# Altium footprint library ref-packages-longpad.PCBLIB: 1527 footprints (part 77 of 103)
Each footprint in its own frame and in the unit in brackets; x right, y up, seen from the top. Pads: shape width x height; smd on the part's side, far side on the other; paste and mask are expansions set on the pad; w line width, h text height; cw(c..) or ccw(c..) is an arc to the next point about the centre after c.
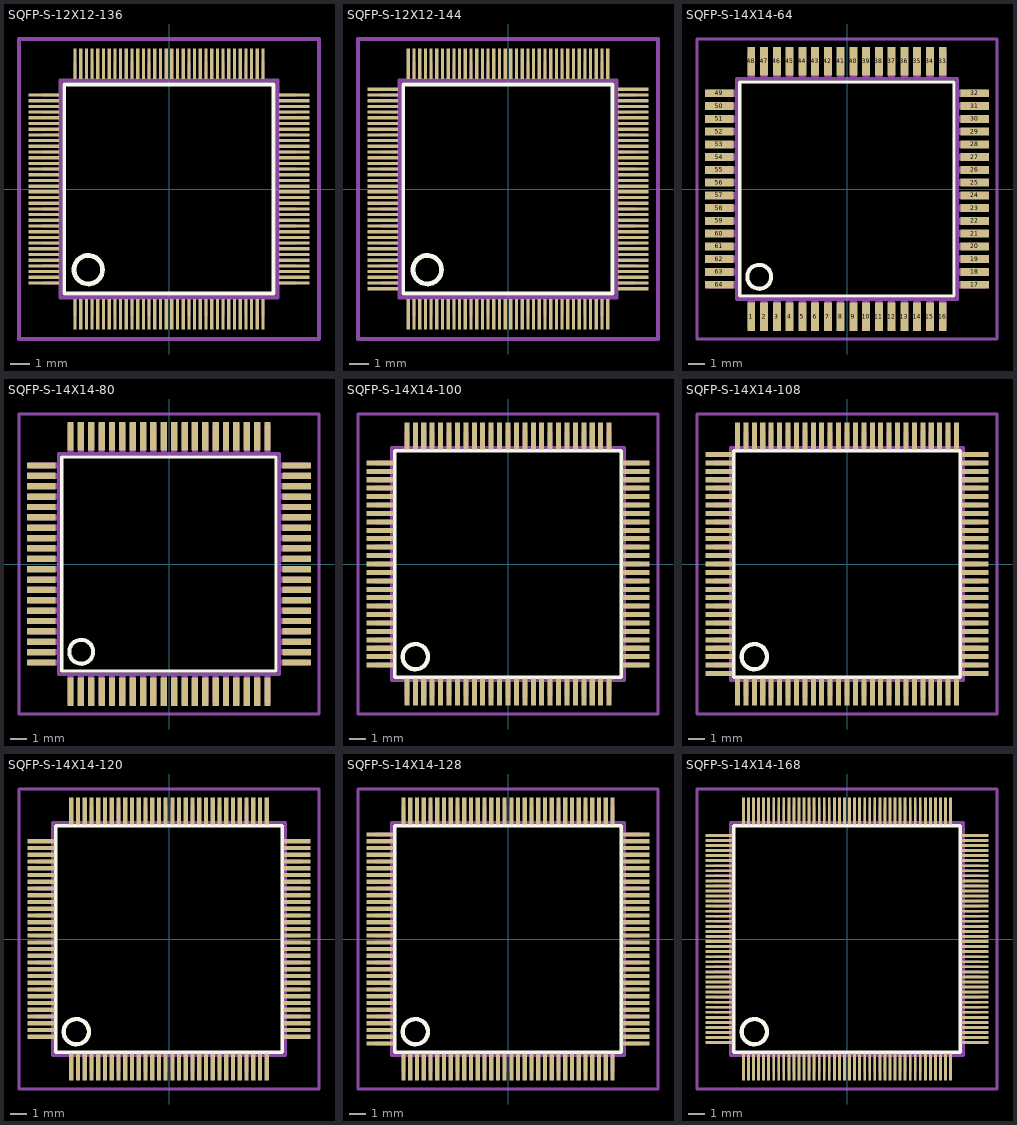
[diagram p76: the footprints below, top view; thin cyan lines are the x and y axes]

## SQFP-S-12X12-136 [mm]
pads (136):
  rect 0.17x1.6 smd: 1(-4.95,-6.6) 2(-4.65,-6.6) 3(-4.35,-6.6) 4(-4.05,-6.6) 5(-3.75,-6.6) 6(-3.45,-6.6) 7(-3.15,-6.6) 8(-2.85,-6.6) 9(-2.55,-6.6) 10(-2.25,-6.6) 11(-1.95,-6.6) 12(-1.65,-6.6) 13(-1.35,-6.6) 14(-1.05,-6.6) 15(-0.75,-6.6) 16(-0.45,-6.6) 17(-0.15,-6.6) 18(0.15,-6.6) 19(0.45,-6.6) 20(0.75,-6.6) 21(1.05,-6.6) 22(1.35,-6.6) 23(1.65,-6.6) 24(1.95,-6.6) 25(2.25,-6.6) 26(2.55,-6.6) 27(2.85,-6.6) 28(3.15,-6.6) 29(3.45,-6.6) 30(3.75,-6.6) 31(4.05,-6.6) 32(4.35,-6.6) 33(4.65,-6.6) 34(4.95,-6.6) 69(4.95,6.6) 70(4.65,6.6) 71(4.35,6.6) 72(4.05,6.6) 73(3.75,6.6) 74(3.45,6.6) 75(3.15,6.6) 76(2.85,6.6) 77(2.55,6.6) 78(2.25,6.6) 79(1.95,6.6) 80(1.65,6.6) 81(1.35,6.6) 82(1.05,6.6) 83(0.75,6.6) 84(0.45,6.6) 85(0.15,6.6) 86(-0.15,6.6) 87(-0.45,6.6) 88(-0.75,6.6) 89(-1.05,6.6) 90(-1.35,6.6) 91(-1.65,6.6) 92(-1.95,6.6) 93(-2.25,6.6) 94(-2.55,6.6) 95(-2.85,6.6) 96(-3.15,6.6) 97(-3.45,6.6) 98(-3.75,6.6) 99(-4.05,6.6) 100(-4.35,6.6) 101(-4.65,6.6) 102(-4.95,6.6)
  rect 1.6x0.17 smd: 35(6.6,-4.95) 36(6.6,-4.65) 37(6.6,-4.35) 38(6.6,-4.05) 39(6.6,-3.75) 40(6.6,-3.45) 41(6.6,-3.15) 42(6.6,-2.85) 43(6.6,-2.55) 44(6.6,-2.25) 45(6.6,-1.95) 46(6.6,-1.65) 47(6.6,-1.35) 48(6.6,-1.05) 49(6.6,-0.75) 50(6.6,-0.45) 51(6.6,-0.15) 52(6.6,0.15) 53(6.6,0.45) 54(6.6,0.75) 55(6.6,1.05) 56(6.6,1.35) 57(6.6,1.65) 58(6.6,1.95) 59(6.6,2.25) 60(6.6,2.55) 61(6.6,2.85) 62(6.6,3.15) 63(6.6,3.45) 64(6.6,3.75) 65(6.6,4.05) 66(6.6,4.35) 67(6.6,4.65) 68(6.6,4.95) 103(-6.6,4.95) 104(-6.6,4.65) 105(-6.6,4.35) 106(-6.6,4.05) 107(-6.6,3.75) 108(-6.6,3.45) 109(-6.6,3.15) 110(-6.6,2.85) 111(-6.6,2.55) 112(-6.6,2.25) 113(-6.6,1.95) 114(-6.6,1.65) 115(-6.6,1.35) 116(-6.6,1.05) 117(-6.6,0.75) 118(-6.6,0.45) 119(-6.6,0.15) 120(-6.6,-0.15) 121(-6.6,-0.45) 122(-6.6,-0.75) 123(-6.6,-1.05) 124(-6.6,-1.35) 125(-6.6,-1.65) 126(-6.6,-1.95) 127(-6.6,-2.25) 128(-6.6,-2.55) 129(-6.6,-2.85) 130(-6.6,-3.15) 131(-6.6,-3.45) 132(-6.6,-3.75) 133(-6.6,-4.05) 134(-6.6,-4.35) 135(-6.6,-4.65) 136(-6.6,-4.95)
Top Overlay:
  circle w0.254: c-4.25,-4.25 r0.75
  lines w0.203: -5.52,-5.51 5.51,-5.51 5.51,5.51 -5.52,5.51 -5.52,-5.51
Mechanical 16:
  rectangle: -5.02,-6.7 -4.88,-5.75
  rectangle: -4.72,-6.7 -4.58,-5.75
  rectangle: -4.42,-6.7 -4.28,-5.75
  rectangle: -4.12,-6.7 -3.98,-5.75
  rectangle: -3.82,-6.7 -3.68,-5.75
  rectangle: -3.52,-6.7 -3.38,-5.75
  rectangle: -3.22,-6.7 -3.08,-5.75
  rectangle: -2.92,-6.7 -2.78,-5.75
  rectangle: -2.62,-6.7 -2.48,-5.75
  rectangle: -2.32,-6.7 -2.18,-5.75
  rectangle: -2.02,-6.7 -1.88,-5.75
  rectangle: -1.72,-6.7 -1.58,-5.75
  rectangle: -1.42,-6.7 -1.28,-5.75
  rectangle: -1.12,-6.7 -0.98,-5.75
  rectangle: -0.82,-6.7 -0.68,-5.75
  rectangle: -0.52,-6.7 -0.38,-5.75
  rectangle: -0.22,-6.7 -0.08,-5.75
  rectangle: 0.08,-6.7 0.22,-5.75
  rectangle: 0.38,-6.7 0.52,-5.75
  rectangle: 0.68,-6.7 0.82,-5.75
  rectangle: 0.98,-6.7 1.12,-5.75
  rectangle: 1.28,-6.7 1.42,-5.75
  rectangle: 1.58,-6.7 1.72,-5.75
  rectangle: 1.88,-6.7 2.02,-5.75
  rectangle: 2.18,-6.7 2.32,-5.75
  rectangle: 2.48,-6.7 2.62,-5.75
  rectangle: 2.78,-6.7 2.92,-5.75
  rectangle: 3.08,-6.7 3.22,-5.75
  rectangle: 3.38,-6.7 3.52,-5.75
  rectangle: 3.68,-6.7 3.82,-5.75
  rectangle: 3.98,-6.7 4.12,-5.75
  rectangle: 4.28,-6.7 4.42,-5.75
  rectangle: 4.58,-6.7 4.72,-5.75
  rectangle: 4.88,-6.7 5.02,-5.75
  rectangle: 5.75,-5.02 6.7,-4.88
  rectangle: 5.75,-4.72 6.7,-4.58
  rectangle: 5.75,-4.42 6.7,-4.28
  rectangle: 5.75,-4.12 6.7,-3.98
  rectangle: 5.75,-3.82 6.7,-3.68
  rectangle: 5.75,-3.52 6.7,-3.38
  rectangle: 5.75,-3.22 6.7,-3.08
  rectangle: 5.75,-2.92 6.7,-2.78
  rectangle: 5.75,-2.62 6.7,-2.48
  rectangle: 5.75,-2.32 6.7,-2.18
  rectangle: 5.75,-2.02 6.7,-1.88
  rectangle: 5.75,-1.72 6.7,-1.58
  rectangle: 5.75,-1.42 6.7,-1.28
  rectangle: 5.75,-1.12 6.7,-0.98
  rectangle: 5.75,-0.82 6.7,-0.68
  rectangle: 5.75,-0.52 6.7,-0.38
  rectangle: 5.75,-0.22 6.7,-0.08
  rectangle: 5.75,0.08 6.7,0.22
  rectangle: 5.75,0.38 6.7,0.52
  rectangle: 5.75,0.68 6.7,0.82
  rectangle: 5.75,0.98 6.7,1.12
  rectangle: 5.75,1.28 6.7,1.42
  rectangle: 5.75,1.58 6.7,1.72
  rectangle: 5.75,1.88 6.7,2.02
  rectangle: 5.75,2.18 6.7,2.32
  rectangle: 5.75,2.48 6.7,2.62
  rectangle: 5.75,2.78 6.7,2.92
  rectangle: 5.75,3.08 6.7,3.22
  rectangle: 5.75,3.38 6.7,3.52
  rectangle: 5.75,3.68 6.7,3.82
  rectangle: 5.75,3.98 6.7,4.12
  rectangle: 5.75,4.28 6.7,4.42
  rectangle: 5.75,4.58 6.7,4.72
  rectangle: 5.75,4.88 6.7,5.02
  rectangle: 4.88,5.75 5.02,6.7
  rectangle: 4.58,5.75 4.72,6.7
  rectangle: 4.28,5.75 4.42,6.7
  rectangle: 3.98,5.75 4.12,6.7
  rectangle: 3.68,5.75 3.82,6.7
  rectangle: 3.38,5.75 3.52,6.7
  rectangle: 3.08,5.75 3.22,6.7
  rectangle: 2.78,5.75 2.92,6.7
  rectangle: 2.48,5.75 2.62,6.7
  rectangle: 2.18,5.75 2.32,6.7
  rectangle: 1.88,5.75 2.02,6.7
  rectangle: 1.58,5.75 1.72,6.7
  rectangle: 1.28,5.75 1.42,6.7
  rectangle: 0.98,5.75 1.12,6.7
  rectangle: 0.68,5.75 0.82,6.7
  rectangle: 0.38,5.75 0.52,6.7
  rectangle: 0.08,5.75 0.22,6.7
  rectangle: -0.22,5.75 -0.08,6.7
  rectangle: -0.52,5.75 -0.38,6.7
  rectangle: -0.82,5.75 -0.68,6.7
  rectangle: -1.12,5.75 -0.98,6.7
  rectangle: -1.42,5.75 -1.28,6.7
  rectangle: -1.72,5.75 -1.58,6.7
  rectangle: -2.02,5.75 -1.88,6.7
  rectangle: -2.32,5.75 -2.18,6.7
  rectangle: -2.62,5.75 -2.48,6.7
  rectangle: -2.92,5.75 -2.78,6.7
  rectangle: -3.22,5.75 -3.08,6.7
  rectangle: -3.52,5.75 -3.38,6.7
  rectangle: -3.82,5.75 -3.68,6.7
  rectangle: -4.12,5.75 -3.98,6.7
  rectangle: -4.42,5.75 -4.28,6.7
  rectangle: -4.72,5.75 -4.58,6.7
  rectangle: -5.02,5.75 -4.88,6.7
  rectangle: -6.7,4.88 -5.75,5.02
  rectangle: -6.7,4.58 -5.75,4.72
  rectangle: -6.7,4.28 -5.75,4.42
  rectangle: -6.7,3.98 -5.75,4.12
  rectangle: -6.7,3.68 -5.75,3.82
  rectangle: -6.7,3.38 -5.75,3.52
  rectangle: -6.7,3.08 -5.75,3.22
  rectangle: -6.7,2.78 -5.75,2.92
  rectangle: -6.7,2.48 -5.75,2.62
  rectangle: -6.7,2.18 -5.75,2.32
  rectangle: -6.7,1.88 -5.75,2.02
  rectangle: -6.7,1.58 -5.75,1.72
  rectangle: -6.7,1.28 -5.75,1.42
  rectangle: -6.7,0.98 -5.75,1.12
  rectangle: -6.7,0.68 -5.75,0.82
  rectangle: -6.7,0.38 -5.75,0.52
  rectangle: -6.7,0.08 -5.75,0.22
  rectangle: -6.7,-0.22 -5.75,-0.08
  rectangle: -6.7,-0.52 -5.75,-0.38
  rectangle: -6.7,-0.82 -5.75,-0.68
  rectangle: -6.7,-1.12 -5.75,-0.98
  rectangle: -6.7,-1.42 -5.75,-1.28
  rectangle: -6.7,-1.72 -5.75,-1.58
  rectangle: -6.7,-2.02 -5.75,-1.88
  rectangle: -6.7,-2.32 -5.75,-2.18
  rectangle: -6.7,-2.62 -5.75,-2.48
  rectangle: -6.7,-2.92 -5.75,-2.78
  rectangle: -6.7,-3.22 -5.75,-3.08
  rectangle: -6.7,-3.52 -5.75,-3.38
  rectangle: -6.7,-3.82 -5.75,-3.68
  rectangle: -6.7,-4.12 -5.75,-3.98
  rectangle: -6.7,-4.42 -5.75,-4.28
  rectangle: -6.7,-4.72 -5.75,-4.58
  rectangle: -6.7,-5.02 -5.75,-4.88
  lines w0.203: -5.71,-5.71 5.71,-5.71 5.71,5.71 -5.71,5.71 -5.71,-5.71
Mechanical 27:
  lines w0.2: -7.9,-7.9 -7.9,7.9 7.9,7.9 7.9,-7.9 -7.9,-7.9

## SQFP-S-12X12-144 [mm]
pads (144):
  rect 0.17x1.6 smd: 1(-5.25,-6.6) 2(-4.95,-6.6) 3(-4.65,-6.6) 4(-4.35,-6.6) 5(-4.05,-6.6) 6(-3.75,-6.6) 7(-3.45,-6.6) 8(-3.15,-6.6) 9(-2.85,-6.6) 10(-2.55,-6.6) 11(-2.25,-6.6) 12(-1.95,-6.6) 13(-1.65,-6.6) 14(-1.35,-6.6) 15(-1.05,-6.6) 16(-0.75,-6.6) 17(-0.45,-6.6) 18(-0.15,-6.6) 19(0.15,-6.6) 20(0.45,-6.6) 21(0.75,-6.6) 22(1.05,-6.6) 23(1.35,-6.6) 24(1.65,-6.6) 25(1.95,-6.6) 26(2.25,-6.6) 27(2.55,-6.6) 28(2.85,-6.6) 29(3.15,-6.6) 30(3.45,-6.6) 31(3.75,-6.6) 32(4.05,-6.6) 33(4.35,-6.6) 34(4.65,-6.6) 35(4.95,-6.6) 36(5.25,-6.6) 73(5.25,6.6) 74(4.95,6.6) 75(4.65,6.6) 76(4.35,6.6) 77(4.05,6.6) 78(3.75,6.6) 79(3.45,6.6) 80(3.15,6.6) 81(2.85,6.6) 82(2.55,6.6) 83(2.25,6.6) 84(1.95,6.6) 85(1.65,6.6) 86(1.35,6.6) 87(1.05,6.6) 88(0.75,6.6) 89(0.45,6.6) 90(0.15,6.6) 91(-0.15,6.6) 92(-0.45,6.6) 93(-0.75,6.6) 94(-1.05,6.6) 95(-1.35,6.6) 96(-1.65,6.6) 97(-1.95,6.6) 98(-2.25,6.6) 99(-2.55,6.6) 100(-2.85,6.6) 101(-3.15,6.6) 102(-3.45,6.6) 103(-3.75,6.6) 104(-4.05,6.6) 105(-4.35,6.6) 106(-4.65,6.6) 107(-4.95,6.6) 108(-5.25,6.6)
  rect 1.6x0.17 smd: 37(6.6,-5.25) 38(6.6,-4.95) 39(6.6,-4.65) 40(6.6,-4.35) 41(6.6,-4.05) 42(6.6,-3.75) 43(6.6,-3.45) 44(6.6,-3.15) 45(6.6,-2.85) 46(6.6,-2.55) 47(6.6,-2.25) 48(6.6,-1.95) 49(6.6,-1.65) 50(6.6,-1.35) 51(6.6,-1.05) 52(6.6,-0.75) 53(6.6,-0.45) 54(6.6,-0.15) 55(6.6,0.15) 56(6.6,0.45) 57(6.6,0.75) 58(6.6,1.05) 59(6.6,1.35) 60(6.6,1.65) 61(6.6,1.95) 62(6.6,2.25) 63(6.6,2.55) 64(6.6,2.85) 65(6.6,3.15) 66(6.6,3.45) 67(6.6,3.75) 68(6.6,4.05) 69(6.6,4.35) 70(6.6,4.65) 71(6.6,4.95) 72(6.6,5.25) 109(-6.6,5.25) 110(-6.6,4.95) 111(-6.6,4.65) 112(-6.6,4.35) 113(-6.6,4.05) 114(-6.6,3.75) 115(-6.6,3.45) 116(-6.6,3.15) 117(-6.6,2.85) 118(-6.6,2.55) 119(-6.6,2.25) 120(-6.6,1.95) 121(-6.6,1.65) 122(-6.6,1.35) 123(-6.6,1.05) 124(-6.6,0.75) 125(-6.6,0.45) 126(-6.6,0.15) 127(-6.6,-0.15) 128(-6.6,-0.45) 129(-6.6,-0.75) 130(-6.6,-1.05) 131(-6.6,-1.35) 132(-6.6,-1.65) 133(-6.6,-1.95) 134(-6.6,-2.25) 135(-6.6,-2.55) 136(-6.6,-2.85) 137(-6.6,-3.15) 138(-6.6,-3.45) 139(-6.6,-3.75) 140(-6.6,-4.05) 141(-6.6,-4.35) 142(-6.6,-4.65) 143(-6.6,-4.95) 144(-6.6,-5.25)
Top Overlay:
  circle w0.254: c-4.25,-4.25 r0.75
  lines w0.203: -5.52,-5.51 5.51,-5.51 5.51,5.51 -5.52,5.51 -5.52,-5.51
Mechanical 16:
  rectangle: -5.32,-6.7 -5.18,-5.75
  rectangle: -5.02,-6.7 -4.88,-5.75
  rectangle: -4.72,-6.7 -4.58,-5.75
  rectangle: -4.42,-6.7 -4.28,-5.75
  rectangle: -4.12,-6.7 -3.98,-5.75
  rectangle: -3.82,-6.7 -3.68,-5.75
  rectangle: -3.52,-6.7 -3.38,-5.75
  rectangle: -3.22,-6.7 -3.08,-5.75
  rectangle: -2.92,-6.7 -2.78,-5.75
  rectangle: -2.62,-6.7 -2.48,-5.75
  rectangle: -2.32,-6.7 -2.18,-5.75
  rectangle: -2.02,-6.7 -1.88,-5.75
  rectangle: -1.72,-6.7 -1.58,-5.75
  rectangle: -1.42,-6.7 -1.28,-5.75
  rectangle: -1.12,-6.7 -0.98,-5.75
  rectangle: -0.82,-6.7 -0.68,-5.75
  rectangle: -0.52,-6.7 -0.38,-5.75
  rectangle: -0.22,-6.7 -0.08,-5.75
  rectangle: 0.08,-6.7 0.22,-5.75
  rectangle: 0.38,-6.7 0.52,-5.75
  rectangle: 0.68,-6.7 0.82,-5.75
  rectangle: 0.98,-6.7 1.12,-5.75
  rectangle: 1.28,-6.7 1.42,-5.75
  rectangle: 1.58,-6.7 1.72,-5.75
  rectangle: 1.88,-6.7 2.02,-5.75
  rectangle: 2.18,-6.7 2.32,-5.75
  rectangle: 2.48,-6.7 2.62,-5.75
  rectangle: 2.78,-6.7 2.92,-5.75
  rectangle: 3.08,-6.7 3.22,-5.75
  rectangle: 3.38,-6.7 3.52,-5.75
  rectangle: 3.68,-6.7 3.82,-5.75
  rectangle: 3.98,-6.7 4.12,-5.75
  rectangle: 4.28,-6.7 4.42,-5.75
  rectangle: 4.58,-6.7 4.72,-5.75
  rectangle: 4.88,-6.7 5.02,-5.75
  rectangle: 5.18,-6.7 5.32,-5.75
  rectangle: 5.75,-5.32 6.7,-5.18
  rectangle: 5.75,-5.02 6.7,-4.88
  rectangle: 5.75,-4.72 6.7,-4.58
  rectangle: 5.75,-4.42 6.7,-4.28
  rectangle: 5.75,-4.12 6.7,-3.98
  rectangle: 5.75,-3.82 6.7,-3.68
  rectangle: 5.75,-3.52 6.7,-3.38
  rectangle: 5.75,-3.22 6.7,-3.08
  rectangle: 5.75,-2.92 6.7,-2.78
  rectangle: 5.75,-2.62 6.7,-2.48
  rectangle: 5.75,-2.32 6.7,-2.18
  rectangle: 5.75,-2.02 6.7,-1.88
  rectangle: 5.75,-1.72 6.7,-1.58
  rectangle: 5.75,-1.42 6.7,-1.28
  rectangle: 5.75,-1.12 6.7,-0.98
  rectangle: 5.75,-0.82 6.7,-0.68
  rectangle: 5.75,-0.52 6.7,-0.38
  rectangle: 5.75,-0.22 6.7,-0.08
  rectangle: 5.75,0.08 6.7,0.22
  rectangle: 5.75,0.38 6.7,0.52
  rectangle: 5.75,0.68 6.7,0.82
  rectangle: 5.75,0.98 6.7,1.12
  rectangle: 5.75,1.28 6.7,1.42
  rectangle: 5.75,1.58 6.7,1.72
  rectangle: 5.75,1.88 6.7,2.02
  rectangle: 5.75,2.18 6.7,2.32
  rectangle: 5.75,2.48 6.7,2.62
  rectangle: 5.75,2.78 6.7,2.92
  rectangle: 5.75,3.08 6.7,3.22
  rectangle: 5.75,3.38 6.7,3.52
  rectangle: 5.75,3.68 6.7,3.82
  rectangle: 5.75,3.98 6.7,4.12
  rectangle: 5.75,4.28 6.7,4.42
  rectangle: 5.75,4.58 6.7,4.72
  rectangle: 5.75,4.88 6.7,5.02
  rectangle: 5.75,5.18 6.7,5.32
  rectangle: 5.18,5.75 5.32,6.7
  rectangle: 4.88,5.75 5.02,6.7
  rectangle: 4.58,5.75 4.72,6.7
  rectangle: 4.28,5.75 4.42,6.7
  rectangle: 3.98,5.75 4.12,6.7
  rectangle: 3.68,5.75 3.82,6.7
  rectangle: 3.38,5.75 3.52,6.7
  rectangle: 3.08,5.75 3.22,6.7
  rectangle: 2.78,5.75 2.92,6.7
  rectangle: 2.48,5.75 2.62,6.7
  rectangle: 2.18,5.75 2.32,6.7
  rectangle: 1.88,5.75 2.02,6.7
  rectangle: 1.58,5.75 1.72,6.7
  rectangle: 1.28,5.75 1.42,6.7
  rectangle: 0.98,5.75 1.12,6.7
  rectangle: 0.68,5.75 0.82,6.7
  rectangle: 0.38,5.75 0.52,6.7
  rectangle: 0.08,5.75 0.22,6.7
  rectangle: -0.22,5.75 -0.08,6.7
  rectangle: -0.52,5.75 -0.38,6.7
  rectangle: -0.82,5.75 -0.68,6.7
  rectangle: -1.12,5.75 -0.98,6.7
  rectangle: -1.42,5.75 -1.28,6.7
  rectangle: -1.72,5.75 -1.58,6.7
  rectangle: -2.02,5.75 -1.88,6.7
  rectangle: -2.32,5.75 -2.18,6.7
  rectangle: -2.62,5.75 -2.48,6.7
  rectangle: -2.92,5.75 -2.78,6.7
  rectangle: -3.22,5.75 -3.08,6.7
  rectangle: -3.52,5.75 -3.38,6.7
  rectangle: -3.82,5.75 -3.68,6.7
  rectangle: -4.12,5.75 -3.98,6.7
  rectangle: -4.42,5.75 -4.28,6.7
  rectangle: -4.72,5.75 -4.58,6.7
  rectangle: -5.02,5.75 -4.88,6.7
  rectangle: -5.32,5.75 -5.18,6.7
  rectangle: -6.7,5.18 -5.75,5.32
  rectangle: -6.7,4.88 -5.75,5.02
  rectangle: -6.7,4.58 -5.75,4.72
  rectangle: -6.7,4.28 -5.75,4.42
  rectangle: -6.7,3.98 -5.75,4.12
  rectangle: -6.7,3.68 -5.75,3.82
  rectangle: -6.7,3.38 -5.75,3.52
  rectangle: -6.7,3.08 -5.75,3.22
  rectangle: -6.7,2.78 -5.75,2.92
  rectangle: -6.7,2.48 -5.75,2.62
  rectangle: -6.7,2.18 -5.75,2.32
  rectangle: -6.7,1.88 -5.75,2.02
  rectangle: -6.7,1.58 -5.75,1.72
  rectangle: -6.7,1.28 -5.75,1.42
  rectangle: -6.7,0.98 -5.75,1.12
  rectangle: -6.7,0.68 -5.75,0.82
  rectangle: -6.7,0.38 -5.75,0.52
  rectangle: -6.7,0.08 -5.75,0.22
  rectangle: -6.7,-0.22 -5.75,-0.08
  rectangle: -6.7,-0.52 -5.75,-0.38
  rectangle: -6.7,-0.82 -5.75,-0.68
  rectangle: -6.7,-1.12 -5.75,-0.98
  rectangle: -6.7,-1.42 -5.75,-1.28
  rectangle: -6.7,-1.72 -5.75,-1.58
  rectangle: -6.7,-2.02 -5.75,-1.88
  rectangle: -6.7,-2.32 -5.75,-2.18
  rectangle: -6.7,-2.62 -5.75,-2.48
  rectangle: -6.7,-2.92 -5.75,-2.78
  rectangle: -6.7,-3.22 -5.75,-3.08
  rectangle: -6.7,-3.52 -5.75,-3.38
  rectangle: -6.7,-3.82 -5.75,-3.68
  rectangle: -6.7,-4.12 -5.75,-3.98
  rectangle: -6.7,-4.42 -5.75,-4.28
  rectangle: -6.7,-4.72 -5.75,-4.58
  rectangle: -6.7,-5.02 -5.75,-4.88
  rectangle: -6.7,-5.32 -5.75,-5.18
  lines w0.203: -5.71,-5.71 5.71,-5.71 5.71,5.71 -5.71,5.71 -5.71,-5.71
Mechanical 27:
  lines w0.2: -7.9,-7.9 -7.9,7.9 7.9,7.9 7.9,-7.9 -7.9,-7.9

## SQFP-S-14X14-64 [mm]
pads (64):
  rect 0.5x1.8 smd: 1(-6,-8) 2(-5.2,-8) 3(-4.4,-8) 4(-3.6,-8) 5(-2.8,-8) 6(-2,-8) 7(-1.2,-8) 8(-0.4,-8) 9(0.4,-8) 10(1.2,-8) 11(2,-8) 12(2.8,-8) 13(3.6,-8) 14(4.4,-8) 15(5.2,-8) 16(6,-8) 33(6,8) 34(5.2,8) 35(4.4,8) 36(3.6,8) 37(2.8,8) 38(2,8) 39(1.2,8) 40(0.4,8) 41(-0.4,8) 42(-1.2,8) 43(-2,8) 44(-2.8,8) 45(-3.6,8) 46(-4.4,8) 47(-5.2,8) 48(-6,8)
  rect 1.8x0.5 smd: 17(8,-6) 18(8,-5.2) 19(8,-4.4) 20(8,-3.6) 21(8,-2.8) 22(8,-2) 23(8,-1.2) 24(8,-0.4) 25(8,0.4) 26(8,1.2) 27(8,2) 28(8,2.8) 29(8,3.6) 30(8,4.4) 31(8,5.2) 32(8,6) 49(-8,6) 50(-8,5.2) 51(-8,4.4) 52(-8,3.6) 53(-8,2.8) 54(-8,2) 55(-8,1.2) 56(-8,0.4) 57(-8,-0.4) 58(-8,-1.2) 59(-8,-2) 60(-8,-2.8) 61(-8,-3.6) 62(-8,-4.4) 63(-8,-5.2) 64(-8,-6)
Top Overlay:
  circle w0.254: c-5.5,-5.5 r0.75
  lines w0.203: -6.72,-6.71 6.71,-6.71 6.71,6.71 -6.72,6.71 -6.72,-6.71
Mechanical 16:
  rectangle: -6.22,-8.72 -5.78,-6.95
  rectangle: -5.42,-8.72 -4.98,-6.95
  rectangle: -4.62,-8.72 -4.18,-6.95
  rectangle: -3.82,-8.72 -3.38,-6.95
  rectangle: -3.02,-8.72 -2.58,-6.95
  rectangle: -2.22,-8.72 -1.78,-6.95
  rectangle: -1.42,-8.72 -0.98,-6.95
  rectangle: -0.62,-8.72 -0.18,-6.95
  rectangle: 0.18,-8.72 0.62,-6.95
  rectangle: 0.98,-8.72 1.42,-6.95
  rectangle: 1.78,-8.72 2.22,-6.95
  rectangle: 2.58,-8.72 3.02,-6.95
  rectangle: 3.38,-8.72 3.82,-6.95
  rectangle: 4.18,-8.72 4.62,-6.95
  rectangle: 4.98,-8.72 5.42,-6.95
  rectangle: 5.78,-8.72 6.22,-6.95
  rectangle: 6.95,-6.22 8.72,-5.78
  rectangle: 6.95,-5.42 8.72,-4.98
  rectangle: 6.95,-4.62 8.72,-4.18
  rectangle: 6.95,-3.82 8.72,-3.38
  rectangle: 6.95,-3.02 8.72,-2.58
  rectangle: 6.95,-2.22 8.72,-1.78
  rectangle: 6.95,-1.42 8.72,-0.98
  rectangle: 6.95,-0.62 8.72,-0.18
  rectangle: 6.95,0.18 8.72,0.62
  rectangle: 6.95,0.98 8.72,1.42
  rectangle: 6.95,1.78 8.72,2.22
  rectangle: 6.95,2.58 8.72,3.02
  rectangle: 6.95,3.38 8.72,3.82
  rectangle: 6.95,4.18 8.72,4.62
  rectangle: 6.95,4.98 8.72,5.42
  rectangle: 6.95,5.78 8.72,6.22
  rectangle: 5.78,6.95 6.22,8.72
  rectangle: 4.98,6.95 5.42,8.72
  rectangle: 4.18,6.95 4.62,8.72
  rectangle: 3.38,6.95 3.82,8.72
  rectangle: 2.58,6.95 3.02,8.72
  rectangle: 1.78,6.95 2.22,8.72
  rectangle: 0.98,6.95 1.42,8.72
  rectangle: 0.18,6.95 0.62,8.72
  rectangle: -0.62,6.95 -0.18,8.72
  rectangle: -1.42,6.95 -0.98,8.72
  rectangle: -2.22,6.95 -1.78,8.72
  rectangle: -3.02,6.95 -2.58,8.72
  rectangle: -3.82,6.95 -3.38,8.72
  rectangle: -4.62,6.95 -4.18,8.72
  rectangle: -5.42,6.95 -4.98,8.72
  rectangle: -6.22,6.95 -5.78,8.72
  rectangle: -8.72,5.78 -6.95,6.22
  rectangle: -8.72,4.98 -6.95,5.42
  rectangle: -8.72,4.18 -6.95,4.62
  rectangle: -8.72,3.38 -6.95,3.82
  rectangle: -8.72,2.58 -6.95,3.02
  rectangle: -8.72,1.78 -6.95,2.22
  rectangle: -8.72,0.98 -6.95,1.42
  rectangle: -8.72,0.18 -6.95,0.62
  rectangle: -8.72,-0.62 -6.95,-0.18
  rectangle: -8.72,-1.42 -6.95,-0.98
  rectangle: -8.72,-2.22 -6.95,-1.78
  rectangle: -8.72,-3.02 -6.95,-2.58
  rectangle: -8.72,-3.82 -6.95,-3.38
  rectangle: -8.72,-4.62 -6.95,-4.18
  rectangle: -8.72,-5.42 -6.95,-4.98
  rectangle: -8.72,-6.22 -6.95,-5.78
  lines w0.203: -6.91,-6.91 6.91,-6.91 6.91,6.91 -6.91,6.91 -6.91,-6.91
Mechanical 27:
  lines w0.2: -9.4,-9.4 -9.4,9.4 9.4,9.4 9.4,-9.4 -9.4,-9.4

## SQFP-S-14X14-80 [mm]
pads (80):
  rect 0.4x1.8 smd: 1(-6.175,-8) 2(-5.525,-8) 3(-4.875,-8) 4(-4.225,-8) 5(-3.575,-8) 6(-2.925,-8) 7(-2.275,-8) 8(-1.625,-8) 9(-0.975,-8) 10(-0.325,-8) 11(0.325,-8) 12(0.975,-8) 13(1.625,-8) 14(2.275,-8) 15(2.925,-8) 16(3.575,-8) 17(4.225,-8) 18(4.875,-8) 19(5.525,-8) 20(6.175,-8) 41(6.175,8) 42(5.525,8) 43(4.875,8) 44(4.225,8) 45(3.575,8) 46(2.925,8) 47(2.275,8) 48(1.625,8) 49(0.975,8) 50(0.325,8) 51(-0.325,8) 52(-0.975,8) 53(-1.625,8) 54(-2.275,8) 55(-2.925,8) 56(-3.575,8) 57(-4.225,8) 58(-4.875,8) 59(-5.525,8) 60(-6.175,8)
  rect 1.8x0.4 smd: 21(8,-6.175) 22(8,-5.525) 23(8,-4.875) 24(8,-4.225) 25(8,-3.575) 26(8,-2.925) 27(8,-2.275) 28(8,-1.625) 29(8,-0.975) 30(8,-0.325) 31(8,0.325) 32(8,0.975) 33(8,1.625) 34(8,2.275) 35(8,2.925) 36(8,3.575) 37(8,4.225) 38(8,4.875) 39(8,5.525) 40(8,6.175) 61(-8,6.175) 62(-8,5.525) 63(-8,4.875) 64(-8,4.225) 65(-8,3.575) 66(-8,2.925) 67(-8,2.275) 68(-8,1.625) 69(-8,0.975) 70(-8,0.325) 71(-8,-0.325) 72(-8,-0.975) 73(-8,-1.625) 74(-8,-2.275) 75(-8,-2.925) 76(-8,-3.575) 77(-8,-4.225) 78(-8,-4.875) 79(-8,-5.525) 80(-8,-6.175)
Top Overlay:
  circle w0.254: c-5.5,-5.5 r0.75
  lines w0.203: -6.72,-6.71 6.71,-6.71 6.71,6.71 -6.72,6.71 -6.72,-6.71
Mechanical 16:
  rectangle: -6.365,-8.72 -5.985,-6.95
  rectangle: -5.715,-8.72 -5.335,-6.95
  rectangle: -5.065,-8.72 -4.685,-6.95
  rectangle: -4.415,-8.72 -4.035,-6.95
  rectangle: -3.765,-8.72 -3.385,-6.95
  rectangle: -3.115,-8.72 -2.735,-6.95
  rectangle: -2.465,-8.72 -2.085,-6.95
  rectangle: -1.815,-8.72 -1.435,-6.95
  rectangle: -1.165,-8.72 -0.785,-6.95
  rectangle: -0.515,-8.72 -0.135,-6.95
  rectangle: 0.135,-8.72 0.515,-6.95
  rectangle: 0.785,-8.72 1.165,-6.95
  rectangle: 1.435,-8.72 1.815,-6.95
  rectangle: 2.085,-8.72 2.465,-6.95
  rectangle: 2.735,-8.72 3.115,-6.95
  rectangle: 3.385,-8.72 3.765,-6.95
  rectangle: 4.035,-8.72 4.415,-6.95
  rectangle: 4.685,-8.72 5.065,-6.95
  rectangle: 5.335,-8.72 5.715,-6.95
  rectangle: 5.985,-8.72 6.365,-6.95
  rectangle: 6.95,-6.365 8.72,-5.985
  rectangle: 6.95,-5.715 8.72,-5.335
  rectangle: 6.95,-5.065 8.72,-4.685
  rectangle: 6.95,-4.415 8.72,-4.035
  rectangle: 6.95,-3.765 8.72,-3.385
  rectangle: 6.95,-3.115 8.72,-2.735
  rectangle: 6.95,-2.465 8.72,-2.085
  rectangle: 6.95,-1.815 8.72,-1.435
  rectangle: 6.95,-1.165 8.72,-0.785
  rectangle: 6.95,-0.515 8.72,-0.135
  rectangle: 6.95,0.135 8.72,0.515
  rectangle: 6.95,0.785 8.72,1.165
  rectangle: 6.95,1.435 8.72,1.815
  rectangle: 6.95,2.085 8.72,2.465
  rectangle: 6.95,2.735 8.72,3.115
  rectangle: 6.95,3.385 8.72,3.765
  rectangle: 6.95,4.035 8.72,4.415
  rectangle: 6.95,4.685 8.72,5.065
  rectangle: 6.95,5.335 8.72,5.715
  rectangle: 6.95,5.985 8.72,6.365
  rectangle: 5.985,6.95 6.365,8.72
  rectangle: 5.335,6.95 5.715,8.72
  rectangle: 4.685,6.95 5.065,8.72
  rectangle: 4.035,6.95 4.415,8.72
  rectangle: 3.385,6.95 3.765,8.72
  rectangle: 2.735,6.95 3.115,8.72
  rectangle: 2.085,6.95 2.465,8.72
  rectangle: 1.435,6.95 1.815,8.72
  rectangle: 0.785,6.95 1.165,8.72
  rectangle: 0.135,6.95 0.515,8.72
  rectangle: -0.515,6.95 -0.135,8.72
  rectangle: -1.165,6.95 -0.785,8.72
  rectangle: -1.815,6.95 -1.435,8.72
  rectangle: -2.465,6.95 -2.085,8.72
  rectangle: -3.115,6.95 -2.735,8.72
  rectangle: -3.765,6.95 -3.385,8.72
  rectangle: -4.415,6.95 -4.035,8.72
  rectangle: -5.065,6.95 -4.685,8.72
  rectangle: -5.715,6.95 -5.335,8.72
  rectangle: -6.365,6.95 -5.985,8.72
  rectangle: -8.72,5.985 -6.95,6.365
  rectangle: -8.72,5.335 -6.95,5.715
  rectangle: -8.72,4.685 -6.95,5.065
  rectangle: -8.72,4.035 -6.95,4.415
  rectangle: -8.72,3.385 -6.95,3.765
  rectangle: -8.72,2.735 -6.95,3.115
  rectangle: -8.72,2.085 -6.95,2.465
  rectangle: -8.72,1.435 -6.95,1.815
  rectangle: -8.72,0.785 -6.95,1.165
  rectangle: -8.72,0.135 -6.95,0.515
  rectangle: -8.72,-0.515 -6.95,-0.135
  rectangle: -8.72,-1.165 -6.95,-0.785
  rectangle: -8.72,-1.815 -6.95,-1.435
  rectangle: -8.72,-2.465 -6.95,-2.085
  rectangle: -8.72,-3.115 -6.95,-2.735
  rectangle: -8.72,-3.765 -6.95,-3.385
  rectangle: -8.72,-4.415 -6.95,-4.035
  rectangle: -8.72,-5.065 -6.95,-4.685
  rectangle: -8.72,-5.715 -6.95,-5.335
  rectangle: -8.72,-6.365 -6.95,-5.985
  lines w0.203: -6.91,-6.91 6.91,-6.91 6.91,6.91 -6.91,6.91 -6.91,-6.91
Mechanical 27:
  lines w0.2: -9.4,-9.4 -9.4,9.4 9.4,9.4 9.4,-9.4 -9.4,-9.4
